# Altium footprint library 400389.PcbLib: 91 footprints (part 1 of 6)
Each footprint in its own frame and in the unit in brackets; x right, y up, seen from the top. Pads: shape width x height; smd on the part's side, far side on the other; paste and mask are expansions set on the pad; w line width, h text height; cw(c..) or ccw(c..) is an arc to the next point about the centre after c.
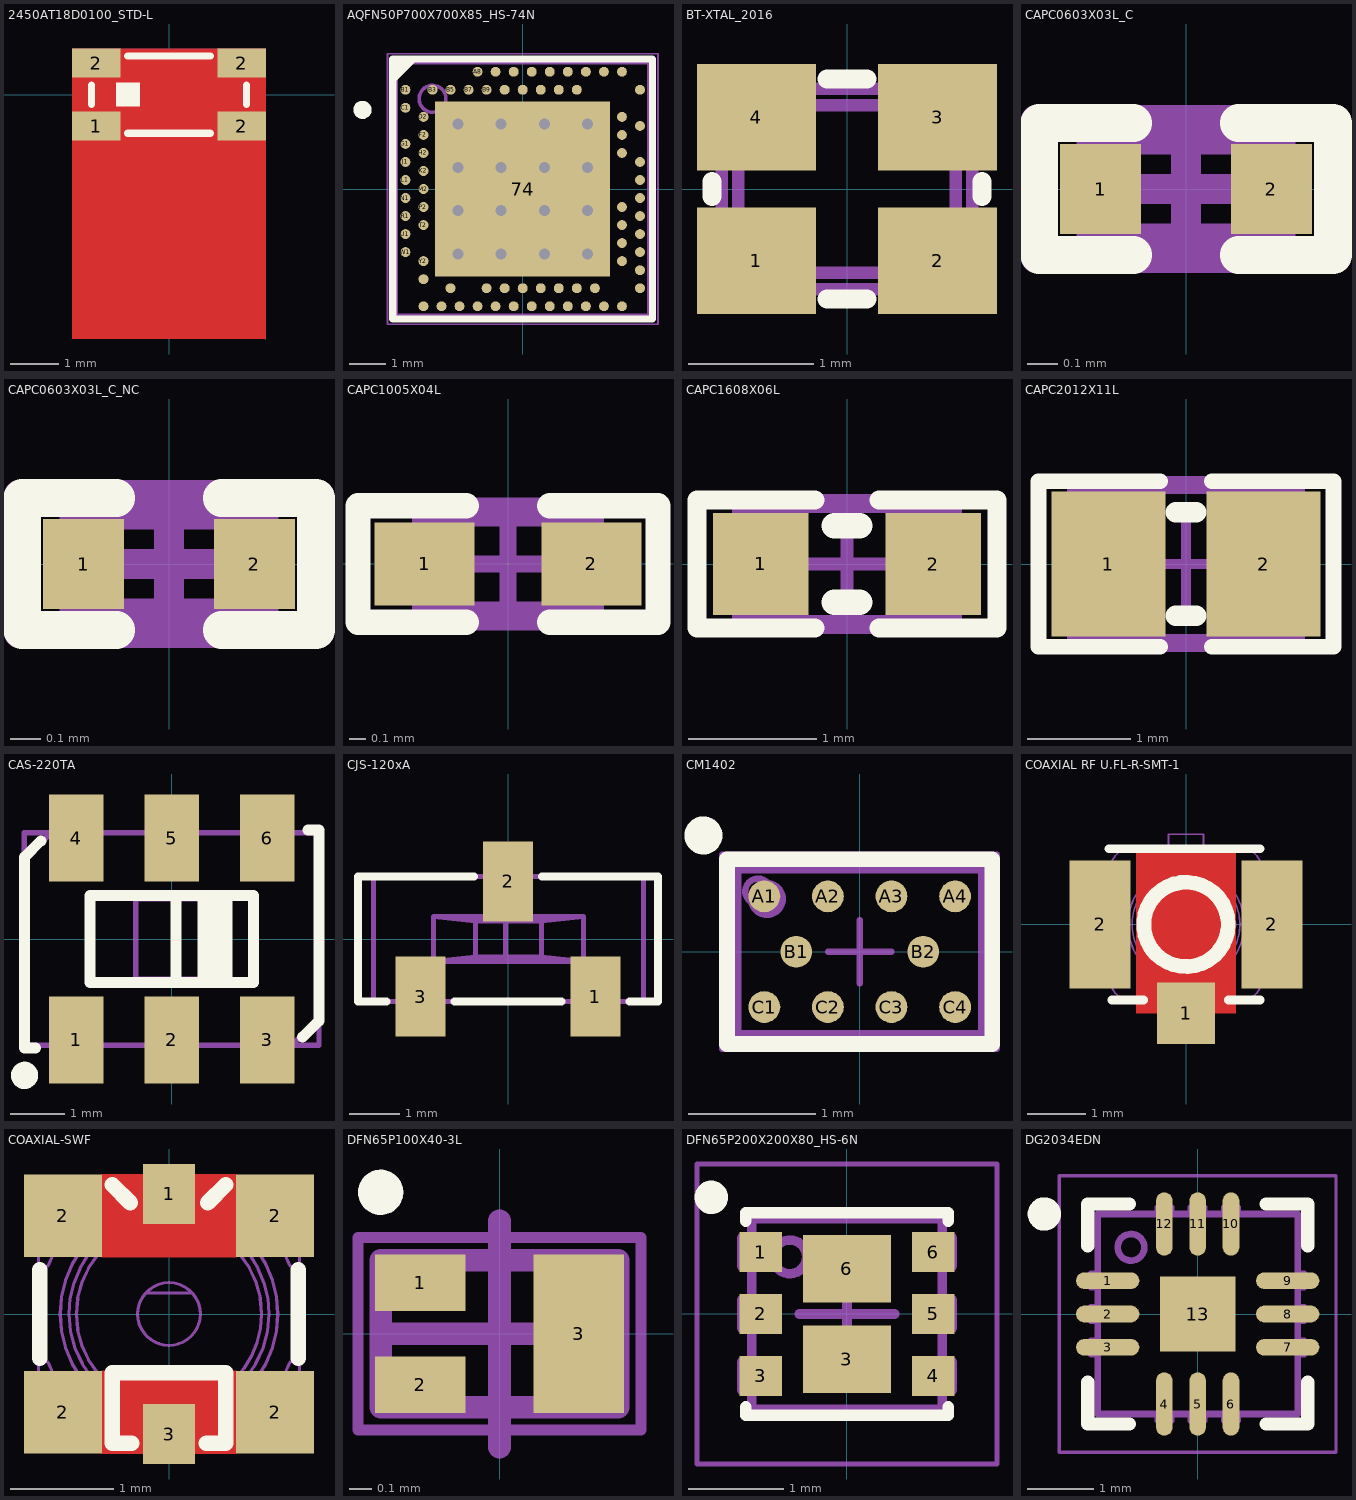
[diagram p0: the footprints below, top view; thin cyan lines are the x and y axes]

## 2450AT18D0100_STD-L [mm]
pads (4):
  rect 1x0.6 smd mask+0.051: 1(-1.5,-0.65) 2(-1.5,0.65) 2(1.5,-0.65) 2(1.5,0.65)
Top Layer:
  pour cut-out: -2,-5.05 -2,0.95 2,0.95 2,-5.05
Bottom Layer:
  pour cut-out: -2,-5.05 -2,0.95 2,0.95 2,-5.05
Top Overlay:
  rectangle: -1.1,-0.25 -0.6,0.25
  lines w0.15: -1.6,-0.2 -1.6,0.2 ; -0.85,-0.8 0.85,-0.8 ; -0.85,0.8 0.85,0.8 ; 1.6,-0.2 1.6,0.2
Mechanical 7:
  lines w0.1: -1.6,-0.5 -1.1,-0.5 -1.1,-0.8 ; -1.6,0.5 -1.1,0.5 -1.1,0.8 ; 1.1,-0.8 1.1,-0.5 1.6,-0.5 ; 1.1,0.8 1.1,0.5 1.6,0.5 ; -1.6,-0.8 1.6,-0.8 1.6,0.8 -1.6,0.8 -1.6,-0.8 ; -1.106,-0.247 -1.106,0.252 -0.607,0.252 -0.607,-0.247 -1.106,-0.247
  text ".Designator" at -0.4,-0.2 h0.38
3D body: height 1.2, standoff 0, extent -1.605,0.505 -1.105,0.805
3D body: height 1.2, standoff 0, extent 1.105,-0.805 1.605,-0.505
3D body: height 1.2, standoff 0, extent 1.105,0.505 1.605,0.805
3D body: height 1.2, standoff 0, extent -1.6,-0.8 1.6,0.8
3D body: height 1.2, standoff 0, extent -1.605,-0.805 -1.105,-0.505
3D body: height 1.2, standoff 0.01, extent -1.099,-0.25 -0.6,0.25

## AQFN50P700X700X85_HS-74N [mm]
pads (90):
  rect 4.85x4.85 smd paste-5 mask+0.05: 74(0,0)
  round 0.275 smd paste+0.012 mask+0.05: A8(-1.25,3.25) A10(-0.75,3.25) A12(-0.25,3.25) A14(0.25,3.25) A16(0.75,3.25) A18(1.25,3.25) A20(1.75,3.25) A22(2.25,3.25) A23(2.75,3.25) AA24(3.25,-2.25) AB2(-2.75,-2.5) AC5(-2,-2.75) AC9(-1,-2.75) AC11(-0.5,-2.75) AC13(0,-2.75) AC15(0.5,-2.75) AC17(1,-2.75) AC19(1.5,-2.75) AC21(2,-2.75) AC24(3.25,-2.75) AD2(-2.75,-3.25) AD4(-2.25,-3.25) AD6(-1.75,-3.25) AD8(-1.25,-3.25) AD10(-0.75,-3.25) AD12(-0.25,-3.25) AD14(0.25,-3.25) AD16(0.75,-3.25) AD18(1.25,-3.25) AD20(1.75,-3.25) AD22(2.25,-3.25) AD23(2.75,-3.25) B1(-3.25,2.75) B3(-2.5,2.75) B5(-2,2.75) B7(-1.5,2.75) B9(-1,2.75) B11(-0.5,2.75) B13(0,2.75) B15(0.5,2.75) B17(1,2.75) B19(1.5,2.75) B24(3.25,2.75) C1(-3.25,2.25) D2(-2.75,2) D23(2.75,2) E24(3.25,1.75) F2(-2.75,1.5) F23(2.75,1.5) G1(-3.25,1.25) H2(-2.75,1) H23(2.75,1) J1(-3.25,0.75) J24(3.25,0.75) K2(-2.75,0.5) L1(-3.25,0.25) L24(3.25,0.25) M2(-2.75,0) N1(-3.25,-0.25) N24(3.25,-0.25) P2(-2.75,-0.5) P23(2.75,-0.5) R1(-3.25,-0.75) R24(3.25,-0.75) T2(-2.75,-1) T23(2.75,-1) U1(-3.25,-1.25) U24(3.25,-1.25) V23(2.75,-1.5) W1(-3.25,-1.75) W24(3.25,-1.75) Y2(-2.75,-2) Y23(2.75,-2)
  rrect50% 0.94x0.94 on Top Paste: ""(-1.71,-1.71) ""(-1.71,-0.57) ""(-1.71,0.57) ""(-1.71,1.71) ""(-0.57,-1.71) ""(-0.57,-0.57) ""(-0.57,0.57) ""(-0.57,1.71) ""(0.57,-1.71) ""(0.57,-0.57) ""(0.57,0.57) ""(0.57,1.71) ""(1.71,-1.71) ""(1.71,-0.57) ""(1.71,0.57) ""(1.71,1.71)
via 1.8,-1.8 diameter 0.61 hole 0.305
via 0.6,-1.8 diameter 0.61 hole 0.305
via -0.6,-1.8 diameter 0.61 hole 0.305
via -1.8,-1.8 diameter 0.61 hole 0.305
via 1.8,-0.6 diameter 0.61 hole 0.305
via 0.6,-0.6 diameter 0.61 hole 0.305
via -0.6,-0.6 diameter 0.61 hole 0.305
via -1.8,-0.6 diameter 0.61 hole 0.305
via 1.8,0.6 diameter 0.61 hole 0.305
via 0.6,0.6 diameter 0.61 hole 0.305
via -0.6,0.6 diameter 0.61 hole 0.305
via -1.8,0.6 diameter 0.61 hole 0.305
via 1.8,1.8 diameter 0.61 hole 0.305
via 0.6,1.8 diameter 0.61 hole 0.305
via -0.6,1.8 diameter 0.61 hole 0.305
via -1.8,1.8 diameter 0.61 hole 0.305
Top Overlay:
  circle w0.25: c-4.44,2.194 r0.125
  region: -3,3.5 -3.5,3 -3.5,3.5
  lines w0.2: -3.6,-3.6 3.6,-3.6 3.6,3.6 -3.6,3.6 -3.6,-3.6
Mechanical 7:
  circle w0.1: c-2.5,2.5 r0.373
  lines w0.1: -3.5,-3.5 -3.5,3.5 3.5,3.5 3.5,-3.5 -3.5,-3.5
  text ".Designator" at -0.75,-0.25 h0.38
Mechanical 15:
  lines w0.05: -3.75,-3.75 3.75,-3.75 3.75,3.75 -3.75,3.75 -3.75,-3.75
  lines w0.1: -0.5,0 0.5,0 ; 0,-0.5 0,0.5
3D body "aQFN-73.step": height 0.87, standoff -0.03, extent -3.5,-3.5 3.5,3.5

## BT-XTAL_2016 [mm]
pads (4):
  rect 0.95x0.85 smd: 1(-0.725,-0.575) 2(0.725,-0.575) 3(0.725,0.575) 4(-0.725,0.575)
Top Overlay:
  lines w0.152: -1.08,-0.06 -1.08,0.06 ; -0.16,-0.88 0.16,-0.88 ; -0.16,0.88 0.16,0.88 ; 1.08,-0.06 1.08,0.06
Mechanical 7:
  lines w0.1: -1,-0.7 cw(c-1,-0.8) -0.9,-0.8 0.9,-0.8 cw(c1,-0.8) 1,-0.7 1,0.7 cw(c1,0.8) 0.9,0.8 -0.9,0.8 cw(c-1,0.8) -1,0.7 -1,-0.7 ; -0.87,-0.57 ccw(c-0.77,-0.57) -0.77,-0.67 0.77,-0.67 ccw(c0.77,-0.57) 0.87,-0.57 0.87,0.57 ccw(c0.77,0.57) 0.77,0.67 -0.77,0.67 ccw(c-0.77,0.57) -0.87,0.57 -0.87,-0.57
  text ".Designator" at -0.7,-0.2 h0.38
3D body: height 0.56, standoff 0.15, extent -0.7,-0.65 0.7,0.65
3D body "User Library-GeyerElectronics_KX5.step": height 0.56, standoff 0, extent -1.05,-0.85 1.05,0.85

## CAPC0603X03L_C [mm]
pads (2):
  rect 0.27x0.3 smd mask+0.05: 1(-0.285,0) 2(0.285,0)
Top Overlay:
  lines w0.125: -0.175,-0.22 -0.49,-0.22 -0.49,0.22 -0.175,0.22 ; 0.175,-0.22 0.49,-0.22 0.49,0.22 0.175,0.22
Mechanical 7:
  lines w0.1: -0.315,-0.165 -0.315,0.165 0.315,0.165 0.315,-0.165 -0.315,-0.165
  text ".Designator" at -0.306,0.268 h0.3
Mechanical 15:
  lines w0.1: -0.165,0 0.165,0 ; 0,-0.165 0,0.165 ; -0.5,-0.23 -0.5,0.23 0.5,0.23 0.5,-0.23 -0.5,-0.23
3D body "User Library-0201(0603M) Cap.step": height 0.3, standoff -0.01, extent -0.305,-0.152 0.305,0.153

## CAPC0603X03L_C_NC [mm]
pads (2):
  rect 0.27x0.3 smd mask+0.05: 1(-0.285,0) 2(0.285,0)
Top Overlay:
  lines w0.125: -0.175,-0.22 -0.49,-0.22 -0.49,0.22 -0.175,0.22 ; 0.175,-0.22 0.49,-0.22 0.49,0.22 0.175,0.22
Mechanical 7:
  lines w0.1: -0.315,-0.165 -0.315,0.165 0.315,0.165 0.315,-0.165 -0.315,-0.165
  text ".Designator" at -0.306,0.268 h0.3
Mechanical 15:
  lines w0.1: -0.165,0 0.165,0 ; 0,-0.165 0,0.165 ; -0.5,-0.23 -0.5,0.23 0.5,0.23 0.5,-0.23 -0.5,-0.23

## CAPC1005X04L [mm]
pads (2):
  rect 0.6x0.5 smd: 1(-0.5,0) 2(0.5,0)
Top Overlay:
  lines w0.152: -0.25,-0.35 -0.9,-0.35 -0.9,0.35 -0.25,0.35 ; 0.25,-0.35 0.9,-0.35 0.9,0.35 0.25,0.35
Mechanical 7:
  lines w0.1: -0.525,-0.275 0.525,-0.275 0.525,0.275 -0.525,0.275 -0.525,-0.275
  text ".Designator" at -0.432,-0.152 h0.3
Mechanical 15:
  lines w0.1: -0.275,0 0.275,0 ; 0,-0.275 0,0.275 ; -0.9,-0.35 -0.9,0.35 0.9,0.35 0.9,-0.35 -0.9,-0.35
3D body "User Library-0402(1005M) Cap.step": height 0.5, standoff -0.01, extent -0.508,-0.254 0.508,0.254

## CAPC1608X06L [mm]
pads (2):
  rect 0.75x0.8 smd: 1(-0.675,0) 2(0.675,0)
Top Overlay:
  lines w0.15: -0.25,-0.5 -1.175,-0.5 -1.175,0.5 -0.25,0.5 ; 0.25,-0.5 1.175,-0.5 1.175,0.5 0.25,0.5
  lines w0.2: -0.1,-0.3 0.1,-0.3 ; -0.1,0.3 0.1,0.3
Mechanical 7:
  lines w0.1: -0.85,-0.45 -0.85,0.45 0.85,0.45 0.85,-0.45 -0.85,-0.45
  text ".Designator" at -0.685,-0.142 h0.38
Mechanical 15:
  lines w0.1: -0.45,0 0.45,0 ; 0,-0.45 0,0.45 ; -1.175,-0.5 1.175,-0.5 1.175,0.5 -1.175,0.5 -1.175,-0.5
3D body "User Library-Chip Capacitor 0603.step": height 0.8, standoff 0, extent -0.8,-0.43 0.8,0.43

## CAPC2012X11L [mm]
pads (2):
  rect 1.1x1.4 smd: 1(-0.75,0) 2(0.75,0)
Top Overlay:
  lines w0.152: -0.25,-0.8 -1.425,-0.8 -1.425,0.8 -0.25,0.8 ; 0.25,-0.8 1.425,-0.8 1.425,0.8 0.25,0.8
  lines w0.2: -0.1,-0.5 0.1,-0.5 ; -0.1,0.5 0.1,0.5
Mechanical 7:
  lines w0.1: -1.1,-0.725 1.1,-0.725 1.1,0.725 -1.1,0.725 -1.1,-0.725
  text ".Designator" at -0.711,-0.152 h0.3
Mechanical 15:
  lines w0.1: -0.5,0 0.5,0 ; 0,-0.5 0,0.5 ; -1.425,-0.8 1.425,-0.8 1.425,0.8 -1.425,0.8 -1.425,-0.8
3D body "SW3dPS-0805 SMD Capacitor.STEP": height 0.77, standoff -0.01, extent -1,-0.625 1,0.625

## CAS-220TA [mm]
pads (6):
  rect 1x1.6 smd: 1(-1.75,-1.85) 2(0,-1.85) 3(1.75,-1.85) 4(-1.75,1.85) 5(0,1.85) 6(1.75,1.85)
Top Overlay:
  circle w0.3: c-2.7,-2.5 r0.1
  rectangle: 0.47,-0.8 1.11,0.8
  lines w0.2: -2.5,-2 -2.7,-2 -2.7,1.5 -2.4,1.8 ; 0.08,-0.8 0.08,0.8 ; 2.4,-1.8 2.7,-1.5 2.7,2 2.5,2 ; -1.5,-0.8 1.5,-0.8 1.5,0.8 -1.5,0.8 -1.5,-0.8
Mechanical 7:
  lines w0.1: -2.7,1.45 -2.2,1.95 ; -2.05,-1.95 -2.05,-2.1 -1.45,-2.1 -1.45,-1.95 ; -2.05,1.95 -2.05,2.1 -1.45,2.1 -1.45,1.95 ; -0.3,-1.95 -0.3,-2.1 0.3,-2.1 0.3,-1.95 ; -0.3,1.95 -0.3,2.1 0.3,2.1 0.3,1.95 ; 0.06,-0.738 0.06,0.738 ; 1.45,-1.95 1.45,-2.1 2.05,-2.1 2.05,-1.95 ; 1.45,1.95 1.45,2.1 2.05,2.1 2.05,1.95 ; 2.2,-1.95 2.7,-1.45 ; -1.5,-0.828 -1.5,0.828 ; -1.5,-0.828 1.5,-0.828 ; -1.5,-0.828 -0.66,-0.738 ; -1.5,0.828 -0.66,0.738 ; -1.5,0.828 1.5,0.828 ; -0.66,-0.738 0.66,-0.738 ; -0.66,-0.738 -0.66,0.738 ; -0.66,0.738 0.66,0.738 ; 0.66,-0.738 0.66,0.738 ; 0.66,-0.738 1.5,-0.828 ; 0.66,0.738 1.5,0.828 ; 1.5,-0.828 1.5,0.828 ; -2.7,-1.95 2.7,-1.95 2.7,1.95 -2.7,1.95 -2.7,-1.95
  text ".Designator" at -0.775,1.075 h0.38
3D body: height 2.5, standoff 2.2, extent -2.7,-2 2.7,-0.8
3D body: height 0.15, standoff 0, extent -0.3,1.305 0.3,2.005
3D body: height 0.15, standoff 0, extent 1.45,-2.005 2.05,-1.305
3D body: height 0.15, standoff 0, extent -2.05,-2.005 -1.45,-1.305
3D body: height 1.2, standoff 0, extent -0.3,2.005 0.3,2.155
3D body: height 1.2, standoff 0, extent 1.45,-2.155 2.05,-2.005
3D body: height 1.2, standoff 0, extent -2.05,-2.155 -1.45,-2.005
3D body: height 2.5, standoff 2.2, extent 1.5,-1.15 2.7,1.15
3D body: height 2.5, standoff 2.2, extent -2.7,-1.15 -1.5,1.15
3D body: height 2.5, standoff 2.2, extent -2.7,0.8 2.7,2
3D body: height 2.2, standoff 0.15, extent -2.7,-2 2.7,2
3D body: height 1.2, standoff 0, extent -0.3,-2.155 0.3,-2.005
3D body: height 0.15, standoff 0, extent -0.3,-2.005 0.3,-1.305
3D body: height 1.2, standoff 0, extent -2.05,2.005 -1.45,2.155
3D body: height 0.15, standoff 0, extent -2.05,1.305 -1.45,2.005
3D body: height 1.2, standoff 0, extent 1.45,2.005 2.05,2.155
3D body: height 0.15, standoff 0, extent 1.45,1.305 2.05,2.005
3D body: height 2.5, standoff 2.22, extent 0.47,-0.8 1.11,0.8
3D body: height 2.22, standoff 2.2, extent 0.08,-0.8 1.5,0.8
3D body: height 2.51, standoff 2.5, extent -1.497,-1.879 -0.9,-1.28

## CJS-120xA [mm]
pads (3):
  rect 1x1.6 smd: 1(1.75,-1.15) 2(0,1.15) 3(-1.75,-1.15)
Top Overlay:
  lines w0.152: -2.43,-1.25 -3,-1.25 -3,1.25 -0.68,1.25 ; -1.07,-1.25 1.07,-1.25 ; 0.68,1.25 3,1.25 3,-1.25 2.43,-1.25
Mechanical 7:
  lines w0.1: -2.04,-1.25 -2.04,-1.4 -1.44,-1.4 -1.44,-1.25 ; -0.29,1.25 -0.29,1.4 0.31,1.4 0.31,1.25 ; 0.07,-0.36 -0.65,-0.36 ; 0.07,0.36 -0.65,0.36 ; 1.46,-1.25 1.46,-1.4 2.06,-1.4 2.06,-1.25 ; -1.49,-0.45 -1.49,0.45 ; -1.49,-0.45 1.51,-0.45 ; -1.49,-0.45 -0.65,-0.36 ; -1.49,0.45 1.51,0.45 ; -1.49,0.45 -0.65,0.36 ; -0.65,-0.36 -0.65,0.36 ; 0.67,-0.36 0.67,0.36 ; 0.67,-0.36 -0.05,-0.36 -0.05,0.36 0.67,0.36 ; 0.67,-0.36 1.51,-0.45 ; 0.67,0.36 1.51,0.45 ; 1.51,-0.45 1.51,0.45 ; -2.69,-1.25 -2.69,1.25 2.71,1.25 2.71,-1.25 -2.69,-1.25
  text ".Designator" at -0.775,-1 h0.38
3D body "User Library-CJS-1200TA -Copal Electronics -SPDT Micro Slide Switch.step": height 2.5, standoff 0, extent -3,-1.4 3,1.45

## CM1402 [mm]
pads (10):
  round 0.25 smd mask+0.05: A1(-0.75,0.435) A2(-0.25,0.435) A3(0.25,0.435) A4(0.75,0.435) B1(-0.5,0) B2(0.5,0) C1(-0.75,-0.435) C2(-0.25,-0.435) C3(0.25,-0.435) C4(0.75,-0.435)
Top Overlay:
  circle w0.2: c-1.23,0.915 r0.05
  lines w0.125: -1.042,-0.727 1.042,-0.727 1.042,0.727 -1.042,0.727 -1.042,-0.727
Mechanical 7:
  circle w0.2: c-0.73,0.415 r0.05
  lines w0.1: -0.98,-0.665 -0.98,0.665 0.98,0.665 0.98,-0.665 -0.98,-0.665
  text ".Designator" at -0.533,-0.127 h0.3
Mechanical 15:
  circle w0.05: c-0.8,0.475 r0.1
  lines w0.05: -0.25,0 0.25,0 ; 0,-0.25 0,0.25 ; -1.08,-0.765 1.08,-0.765 1.08,0.765 -1.08,0.765 -1.08,-0.765
3D body: height 0.72, standoff 0.21, extent -0.98,-0.665 0.98,0.665

## COAXIAL RF U.FL-R-SMT-1 [mm]
pads (3):
  rect 1x1.05 smd: 1(0,-1.525)
  rect 1.05x2.2 smd: 2(-1.475,0) 2(1.475,0)
Top Layer:
  pour cut-out: 0.85,1.3 -0.85,1.3 -0.85,-1.525 0.85,-1.525
Top Overlay:
  circle w0.254: c0,0 r0.725
  lines w0: 0.725,1.3 1.275,1.3
  lines w0.152: -1.325,1.3 1.275,1.3 ; -1.275,-1.3 -0.725,-1.3 ; 0.725,-1.3 1.275,-1.3
Mechanical 7:
  circle w0.03: c0,0 r0.25
  circle w0.03: c0,0 r0.85
  circle w0.03: c0,0 r1
  circle w0.03: c0,0 r0.925
  lines w0.03: -1.3,-0.9 -1.5,-0.9 -1.5,0.9 -1.3,0.9 ; -0.775,-0.346 -0.427,-0.346 ccw(c0,0) 0.427,-0.346 0.775,-0.346 ; -0.775,0.346 -0.427,0.346 cw(c0,0) 0.427,0.346 0.775,0.346 ; -0.3,-1.3 -0.3,-1.55 0.3,-1.55 0.3,-1.3 ; -0.3,0.96 -0.3,1.55 0.3,1.55 0.3,0.96 ; -0.3,1.3 -0.95,1.3 ccw(c-0.95,0.95) -1.3,0.95 -1.3,-0.95 ccw(c-0.95,-0.95) -0.95,-1.3 0.95,-1.3 ccw(c0.95,-0.95) 1.3,-0.95 1.3,0.95 ccw(c0.95,0.95) 0.95,1.3 0.3,1.3 ; 1.3,-0.9 1.5,-0.9 1.5,0.9 1.3,0.9
  text ".Designator" at -0.375,-0.125 h0.38
3D body "U.FL-R-SMT-1.stp": height 1.25, standoff 0, extent -1.5,-1.6 1.5,1.5

## COAXIAL-SWF [mm]
pads (6):
  rect 0.5x0.58 smd: 1(0,1.16) 3(0,-1.16)
  rect 0.75x0.8 smd: 2(-1.025,-0.95) 2(-1.025,0.95) 2(1.025,-0.95) 2(1.025,0.95)
Top Layer:
  pour cut-out: -0.65,0.55 0.65,0.55 0.65,1.35 -0.65,1.35
  pour cut-out: 0.65,-0.55 -0.65,-0.55 -0.65,-1.35 0.65,-1.35
Top Overlay:
  lines w0.15: -1.25,-0.43 -1.25,0.43 ; -0.55,1.25 -0.375,1.075 ; -0.36,-1.25 -0.55,-1.25 -0.55,-0.57 0.55,-0.57 0.55,-1.25 0.36,-1.25 ; 0.375,1.075 0.55,1.25 ; 1.25,-0.43 1.25,0.43
Mechanical 7:
  drawing of 206 lines, arcs and shapes, not listed
  text ".Designator" at -0.785,-0.7 h0.38
3D body: height 0.15, standoff 0, extent -0.227,-1.301 0.227,-0.758
3D body: height 0.15, standoff 0, extent -0.227,0.899 0.227,1.299
3D body: height 0.6, standoff 0.55, extent -1.262,-1.248 1.262,1.251
3D body: height 1.4, standoff 0.6, extent -0.9,-0.9 0.9,0.901
3D body: height 0.75, standoff 0.6, extent -1.05,-1.049 1.05,1.05
3D body: height 0.95, standoff 0.75, extent -1,-0.999 1,1.001
3D body: height 0.6, standoff 0, extent 0.757,0.655 1.262,1.249
3D body: height 0.6, standoff 0, extent 0.757,-1.246 1.262,-0.653
3D body: height 0.6, standoff 0, extent -1.262,-1.25 -0.757,-0.649
3D body: height 0.6, standoff 0, extent -1.262,0.655 -0.757,1.248
3D body: height 0.55, standoff 0.1, extent -1.262,-1.252 1.262,1.253
3D body: height 0.9, standoff 0.6, extent -1.05,-1.049 1.05,1.05
3D body: height 1.25, standoff 0.95, extent -1.05,-1.049 1.05,1.05
3D body: height 1.55, standoff 1.25, extent -1.05,-1.05 1.05,1.05

## DFN65P100X40-3L [mm]
pads (3):
  rect 0.4x0.25 smd mask+0.065: 1(-0.35,0.225) 2(-0.35,-0.225)
  rect 0.4x0.7 smd mask+0.065: 3(0.35,0)
Top Overlay:
  circle w0.1: c-0.525,0.625 r0.05
Mechanical 7:
  lines w0.1: -0.525,-0.325 0.525,-0.325 0.525,0.325 -0.525,0.325 -0.525,-0.325
  text ".Designator" at -0.425,-0.175 h0.38
Mechanical 15:
  lines w0.05: -0.625,-0.425 0.625,-0.425 0.625,0.425 -0.625,0.425 -0.625,-0.425
  lines w0.1: -0.5,0 0.5,0 ; 0,-0.5 0,0.5
3D body "DFN65P100X40-3L.step": height 0.4, standoff 0, extent -0.525,-0.325 0.525,0.325

## DFN65P200X200X80_HS-6N [mm]
pads (8):
  rect 0.45x0.42 smd mask+0.055: 1(-0.905,0.65) 2(-0.905,0) 3(-0.905,-0.65) 4(0.905,-0.65) 5(0.905,0) 6(0.905,0.65)
  rect 0.92x0.71 smd mask+0.055: 3(0,-0.475) 6(0,0.475)
Top Overlay:
  circle w0.25: c-1.425,1.225 r0.05
  lines w0.125: -1.063,-0.978 -1.063,-1.063 1.063,-1.063 1.063,-0.978 ; -1.063,0.978 -1.063,1.063 1.063,1.063 1.063,0.978
Mechanical 7:
  circle w0.1: c-0.6,0.6 r0.177
  lines w0.1: -1,-0.8 -1.105,-0.8 -1.105,-0.5 -1,-0.5 ; -1,-0.15 -1.105,-0.15 -1.105,0.15 -1,0.15 ; -1,0.5 -1.105,0.5 -1.105,0.8 -1,0.8 ; 1,-0.8 1.105,-0.8 1.105,-0.5 1,-0.5 ; 1,-0.15 1.105,-0.15 1.105,0.15 1,0.15 ; 1,0.5 1.105,0.5 1.105,0.8 1,0.8 ; -1,-1 1,-1 1,1 -1,1 -1,-1
  text ".Designator" at -0.6,-0.2 h0.38
Mechanical 15:
  lines w0.05: -1.575,-1.575 1.575,-1.575 1.575,1.575 -1.575,1.575 -1.575,-1.575
  lines w0.1: -0.5,0 0.5,0 ; 0,-0.5 0,0.5
3D body "QFN65P200X200X65-6N.step": height 0.65, standoff 0, extent -1.051,-1.05 1.051,1.05

## DG2034EDN [mm]
pads (13):
  oval 0.95x0.25 smd: 1(-1.35,0.5) 2(-1.35,0) 3(-1.35,-0.5) 7(1.35,-0.5) 8(1.35,0) 9(1.35,0.5)
  oval 0.25x0.95 smd: 4(-0.5,-1.35) 5(0,-1.35) 6(0.5,-1.35) 10(0.5,1.35) 11(0,1.35) 12(-0.5,1.35)
  rect 1.13x1.13 smd: 13(0,0)
Top Overlay:
  circle w0.25: c-2.3,1.5 r0.125
  lines w0.2: -1.65,-1.025 -1.65,-1.65 -1.025,-1.65 ; -1.65,1.025 -1.65,1.65 -1.025,1.65 ; 1.025,-1.65 1.65,-1.65 1.65,-1.025 ; 1.025,1.65 1.65,1.65 1.65,1.025
Mechanical 7:
  circle w0.1: c-1,1 r0.2
  lines w0.1: -1.5,-0.6 -1.6,-0.6 -1.6,-0.4 -1.5,-0.4 ; -1.5,-0.1 -1.6,-0.1 -1.6,0.1 -1.5,0.1 ; -1.5,0.4 -1.6,0.4 -1.6,0.6 -1.5,0.6 ; -0.6,-1.5 -0.6,-1.6 -0.4,-1.6 -0.4,-1.5 ; -0.6,1.5 -0.6,1.6 -0.4,1.6 -0.4,1.5 ; -0.1,-1.5 -0.1,-1.6 0.1,-1.6 0.1,-1.5 ; -0.1,1.5 -0.1,1.6 0.1,1.6 0.1,1.5 ; 0.4,-1.5 0.4,-1.6 0.6,-1.6 0.6,-1.5 ; 0.4,1.5 0.4,1.6 0.6,1.6 0.6,1.5 ; 1.5,-0.6 1.6,-0.6 1.6,-0.4 1.5,-0.4 ; 1.5,-0.1 1.6,-0.1 1.6,0.1 1.5,0.1 ; 1.5,0.4 1.6,0.4 1.6,0.6 1.5,0.6 ; -1.5,-1.5 -1.5,1.5 1.5,1.5 1.5,-1.5 -1.5,-1.5
  text ".Designator" at -0.33,-0.152 h0.38
Mechanical 15:
  lines w0.05: -2.075,-2.075 2.075,-2.075 2.075,2.075 -2.075,2.075 -2.075,-2.075
  lines w0.1: -0.5,0 0.5,0 ; 0,-0.5 0,0.5
3D body "DG2034EDN.step": height 1, standoff 0, extent -1.501,-1.501 1.501,1.501